# Altium footprint library smd-ipc.PCBLIB: 363 footprints (part 18 of 27) (continued)
## SQFP-S-5X5-48 [mm] (continued)
Mechanical 27:
  lines w0.2: -4.4,-4.4 -4.4,4.4 4.4,4.4 4.4,-4.4 -4.4,-4.4

## SQFP-S-5X5-56 [mm]
pads (56):
  rect 0.17x1.6 smd: 1(-1.95,-3.1) 2(-1.65,-3.1) 3(-1.35,-3.1) 4(-1.05,-3.1) 5(-0.75,-3.1) 6(-0.45,-3.1) 7(-0.15,-3.1) 8(0.15,-3.1) 9(0.45,-3.1) 10(0.75,-3.1) 11(1.05,-3.1) 12(1.35,-3.1) 13(1.65,-3.1) 14(1.95,-3.1) 29(1.95,3.1) 30(1.65,3.1) 31(1.35,3.1) 32(1.05,3.1) 33(0.75,3.1) 34(0.45,3.1) 35(0.15,3.1) 36(-0.15,3.1) 37(-0.45,3.1) 38(-0.75,3.1) 39(-1.05,3.1) 40(-1.35,3.1) 41(-1.65,3.1) 42(-1.95,3.1)
  rect 1.6x0.17 smd: 15(3.1,-1.95) 16(3.1,-1.65) 17(3.1,-1.35) 18(3.1,-1.05) 19(3.1,-0.75) 20(3.1,-0.45) 21(3.1,-0.15) 22(3.1,0.15) 23(3.1,0.45) 24(3.1,0.75) 25(3.1,1.05) 26(3.1,1.35) 27(3.1,1.65) 28(3.1,1.95) 43(-3.1,1.95) 44(-3.1,1.65) 45(-3.1,1.35) 46(-3.1,1.05) 47(-3.1,0.75) 48(-3.1,0.45) 49(-3.1,0.15) 50(-3.1,-0.15) 51(-3.1,-0.45) 52(-3.1,-0.75) 53(-3.1,-1.05) 54(-3.1,-1.35) 55(-3.1,-1.65) 56(-3.1,-1.95)
Top Overlay:
  circle w0.254: c-1.25,-1.25 r0.5
  lines w0.203: -2.2,-2.2 2.2,-2.2 2.2,2.2 -2.2,2.2 -2.2,-2.2
Mechanical 16:
  rectangle: -2.02,-3.6 -1.88,-2.45
  rectangle: -1.72,-3.6 -1.58,-2.45
  rectangle: -1.42,-3.6 -1.28,-2.45
  rectangle: -1.12,-3.6 -0.98,-2.45
  rectangle: -0.82,-3.6 -0.68,-2.45
  rectangle: -0.52,-3.6 -0.38,-2.45
  rectangle: -0.22,-3.6 -0.08,-2.45
  rectangle: 0.08,-3.6 0.22,-2.45
  rectangle: 0.38,-3.6 0.52,-2.45
  rectangle: 0.68,-3.6 0.82,-2.45
  rectangle: 0.98,-3.6 1.12,-2.45
  rectangle: 1.28,-3.6 1.42,-2.45
  rectangle: 1.58,-3.6 1.72,-2.45
  rectangle: 1.88,-3.6 2.02,-2.45
  rectangle: 2.45,-2.02 3.6,-1.88
  rectangle: 2.45,-1.72 3.6,-1.58
  rectangle: 2.45,-1.42 3.6,-1.28
  rectangle: 2.45,-1.12 3.6,-0.98
  rectangle: 2.45,-0.82 3.6,-0.68
  rectangle: 2.45,-0.52 3.6,-0.38
  rectangle: 2.45,-0.22 3.6,-0.08
  rectangle: 2.45,0.08 3.6,0.22
  rectangle: 2.45,0.38 3.6,0.52
  rectangle: 2.45,0.68 3.6,0.82
  rectangle: 2.45,0.98 3.6,1.12
  rectangle: 2.45,1.28 3.6,1.42
  rectangle: 2.45,1.58 3.6,1.72
  rectangle: 2.45,1.88 3.6,2.02
  rectangle: 1.88,2.45 2.02,3.6
  rectangle: 1.58,2.45 1.72,3.6
  rectangle: 1.28,2.45 1.42,3.6
  rectangle: 0.98,2.45 1.12,3.6
  rectangle: 0.68,2.45 0.82,3.6
  rectangle: 0.38,2.45 0.52,3.6
  rectangle: 0.08,2.45 0.22,3.6
  rectangle: -0.22,2.45 -0.08,3.6
  rectangle: -0.52,2.45 -0.38,3.6
  rectangle: -0.82,2.45 -0.68,3.6
  rectangle: -1.12,2.45 -0.98,3.6
  rectangle: -1.42,2.45 -1.28,3.6
  rectangle: -1.72,2.45 -1.58,3.6
  rectangle: -2.02,2.45 -1.88,3.6
  rectangle: -3.6,1.88 -2.45,2.02
  rectangle: -3.6,1.58 -2.45,1.72
  rectangle: -3.6,1.28 -2.45,1.42
  rectangle: -3.6,0.98 -2.45,1.12
  rectangle: -3.6,0.68 -2.45,0.82
  rectangle: -3.6,0.38 -2.45,0.52
  rectangle: -3.6,0.08 -2.45,0.22
  rectangle: -3.6,-0.22 -2.45,-0.08
  rectangle: -3.6,-0.52 -2.45,-0.38
  rectangle: -3.6,-0.82 -2.45,-0.68
  rectangle: -3.6,-1.12 -2.45,-0.98
  rectangle: -3.6,-1.42 -2.45,-1.28
  rectangle: -3.6,-1.72 -2.45,-1.58
  rectangle: -3.6,-2.02 -2.45,-1.88
  lines w0.203: -2.4,-2.4 2.4,-2.4 2.4,2.4 -2.4,2.4 -2.4,-2.4
Mechanical 27:
  lines w0.2: -4.4,-4.4 -4.4,4.4 4.4,4.4 4.4,-4.4 -4.4,-4.4

## SQFP-S-6X6-32 [mm]
pads (32):
  rect 0.3x1.6 smd: 1(-1.75,-3.6) 2(-1.25,-3.6) 3(-0.75,-3.6) 4(-0.25,-3.6) 5(0.25,-3.6) 6(0.75,-3.6) 7(1.25,-3.6) 8(1.75,-3.6) 17(1.75,3.6) 18(1.25,3.6) 19(0.75,3.6) 20(0.25,3.6) 21(-0.25,3.6) 22(-0.75,3.6) 23(-1.25,3.6) 24(-1.75,3.6)
  rect 1.6x0.3 smd: 9(3.6,-1.75) 10(3.6,-1.25) 11(3.6,-0.75) 12(3.6,-0.25) 13(3.6,0.25) 14(3.6,0.75) 15(3.6,1.25) 16(3.6,1.75) 25(-3.6,1.75) 26(-3.6,1.25) 27(-3.6,0.75) 28(-3.6,0.25) 29(-3.6,-0.25) 30(-3.6,-0.75) 31(-3.6,-1.25) 32(-3.6,-1.75)
Top Overlay:
  circle w0.254: c-1.75,-1.75 r0.5
  lines w0.203: -2.7,-2.7 2.7,-2.7 2.7,2.7 -2.7,2.7 -2.7,-2.7
Mechanical 16:
  rectangle: -1.9,-4.1 -1.6,-2.95
  rectangle: -1.4,-4.1 -1.1,-2.95
  rectangle: -0.9,-4.1 -0.6,-2.95
  rectangle: -0.4,-4.1 -0.1,-2.95
  rectangle: 0.1,-4.1 0.4,-2.95
  rectangle: 0.6,-4.1 0.9,-2.95
  rectangle: 1.1,-4.1 1.4,-2.95
  rectangle: 1.6,-4.1 1.9,-2.95
  rectangle: 2.95,-1.9 4.1,-1.6
  rectangle: 2.95,-1.4 4.1,-1.1
  rectangle: 2.95,-0.9 4.1,-0.6
  rectangle: 2.95,-0.4 4.1,-0.1
  rectangle: 2.95,0.1 4.1,0.4
  rectangle: 2.95,0.6 4.1,0.9
  rectangle: 2.95,1.1 4.1,1.4
  rectangle: 2.95,1.6 4.1,1.9
  rectangle: 1.6,2.95 1.9,4.1
  rectangle: 1.1,2.95 1.4,4.1
  rectangle: 0.6,2.95 0.9,4.1
  rectangle: 0.1,2.95 0.4,4.1
  rectangle: -0.4,2.95 -0.1,4.1
  rectangle: -0.9,2.95 -0.6,4.1
  rectangle: -1.4,2.95 -1.1,4.1
  rectangle: -1.9,2.95 -1.6,4.1
  rectangle: -4.1,1.6 -2.95,1.9
  rectangle: -4.1,1.1 -2.95,1.4
  rectangle: -4.1,0.6 -2.95,0.9
  rectangle: -4.1,0.1 -2.95,0.4
  rectangle: -4.1,-0.4 -2.95,-0.1
  rectangle: -4.1,-0.9 -2.95,-0.6
  rectangle: -4.1,-1.4 -2.95,-1.1
  rectangle: -4.1,-1.9 -2.95,-1.6
  lines w0.203: -2.9,-2.9 2.9,-2.9 2.9,2.9 -2.9,2.9 -2.9,-2.9
Mechanical 27:
  lines w0.2: -4.9,-4.9 -4.9,4.9 4.9,4.9 4.9,-4.9 -4.9,-4.9

## SQFP-S-6X6-40 [mm]
pads (40):
  rect 0.3x1.6 smd: 1(-2.25,-3.6) 2(-1.75,-3.6) 3(-1.25,-3.6) 4(-0.75,-3.6) 5(-0.25,-3.6) 6(0.25,-3.6) 7(0.75,-3.6) 8(1.25,-3.6) 9(1.75,-3.6) 10(2.25,-3.6) 21(2.25,3.6) 22(1.75,3.6) 23(1.25,3.6) 24(0.75,3.6) 25(0.25,3.6) 26(-0.25,3.6) 27(-0.75,3.6) 28(-1.25,3.6) 29(-1.75,3.6) 30(-2.25,3.6)
  rect 1.6x0.3 smd: 11(3.6,-2.25) 12(3.6,-1.75) 13(3.6,-1.25) 14(3.6,-0.75) 15(3.6,-0.25) 16(3.6,0.25) 17(3.6,0.75) 18(3.6,1.25) 19(3.6,1.75) 20(3.6,2.25) 31(-3.6,2.25) 32(-3.6,1.75) 33(-3.6,1.25) 34(-3.6,0.75) 35(-3.6,0.25) 36(-3.6,-0.25) 37(-3.6,-0.75) 38(-3.6,-1.25) 39(-3.6,-1.75) 40(-3.6,-2.25)
Top Overlay:
  circle w0.254: c-1.75,-1.75 r0.5
  lines w0.203: -2.7,-2.7 2.7,-2.7 2.7,2.7 -2.7,2.7 -2.7,-2.7
Mechanical 16:
  rectangle: -2.4,-4.1 -2.1,-2.95
  rectangle: -1.9,-4.1 -1.6,-2.95
  rectangle: -1.4,-4.1 -1.1,-2.95
  rectangle: -0.9,-4.1 -0.6,-2.95
  rectangle: -0.4,-4.1 -0.1,-2.95
  rectangle: 0.1,-4.1 0.4,-2.95
  rectangle: 0.6,-4.1 0.9,-2.95
  rectangle: 1.1,-4.1 1.4,-2.95
  rectangle: 1.6,-4.1 1.9,-2.95
  rectangle: 2.1,-4.1 2.4,-2.95
  rectangle: 2.95,-2.4 4.1,-2.1
  rectangle: 2.95,-1.9 4.1,-1.6
  rectangle: 2.95,-1.4 4.1,-1.1
  rectangle: 2.95,-0.9 4.1,-0.6
  rectangle: 2.95,-0.4 4.1,-0.1
  rectangle: 2.95,0.1 4.1,0.4
  rectangle: 2.95,0.6 4.1,0.9
  rectangle: 2.95,1.1 4.1,1.4
  rectangle: 2.95,1.6 4.1,1.9
  rectangle: 2.95,2.1 4.1,2.4
  rectangle: 2.1,2.95 2.4,4.1
  rectangle: 1.6,2.95 1.9,4.1
  rectangle: 1.1,2.95 1.4,4.1
  rectangle: 0.6,2.95 0.9,4.1
  rectangle: 0.1,2.95 0.4,4.1
  rectangle: -0.4,2.95 -0.1,4.1
  rectangle: -0.9,2.95 -0.6,4.1
  rectangle: -1.4,2.95 -1.1,4.1
  rectangle: -1.9,2.95 -1.6,4.1
  rectangle: -2.4,2.95 -2.1,4.1
  rectangle: -4.1,2.1 -2.95,2.4
  rectangle: -4.1,1.6 -2.95,1.9
  rectangle: -4.1,1.1 -2.95,1.4
  rectangle: -4.1,0.6 -2.95,0.9
  rectangle: -4.1,0.1 -2.95,0.4
  rectangle: -4.1,-0.4 -2.95,-0.1
  rectangle: -4.1,-0.9 -2.95,-0.6
  rectangle: -4.1,-1.4 -2.95,-1.1
  rectangle: -4.1,-1.9 -2.95,-1.6
  rectangle: -4.1,-2.4 -2.95,-2.1
  lines w0.203: -2.9,-2.9 2.9,-2.9 2.9,2.9 -2.9,2.9 -2.9,-2.9
Mechanical 27:
  lines w0.2: -5.4,-4.9 -5.4,4.9 4.9,4.9 4.9,-4.9 -5.4,-4.9

## SQFP-S-6X6-40-F [mm]
pads (40):
  rect 0.25x1.6 smd: 1(-1.8,-3.6) 2(-1.4,-3.6) 3(-1,-3.6) 4(-0.6,-3.6) 5(-0.2,-3.6) 6(0.2,-3.6) 7(0.6,-3.6) 8(1,-3.6) 9(1.4,-3.6) 10(1.8,-3.6) 21(1.8,3.6) 22(1.4,3.6) 23(1,3.6) 24(0.6,3.6) 25(0.2,3.6) 26(-0.2,3.6) 27(-0.6,3.6) 28(-1,3.6) 29(-1.4,3.6) 30(-1.8,3.6)
  rect 1.6x0.25 smd: 11(3.6,-1.8) 12(3.6,-1.4) 13(3.6,-1) 14(3.6,-0.6) 15(3.6,-0.2) 16(3.6,0.2) 17(3.6,0.6) 18(3.6,1) 19(3.6,1.4) 20(3.6,1.8) 31(-3.6,1.8) 32(-3.6,1.4) 33(-3.6,1) 34(-3.6,0.6) 35(-3.6,0.2) 36(-3.6,-0.2) 37(-3.6,-0.6) 38(-3.6,-1) 39(-3.6,-1.4) 40(-3.6,-1.8)
Top Overlay:
  circle w0.254: c-1.75,-1.75 r0.5
  lines w0.203: -2.7,-2.7 2.7,-2.7 2.7,2.7 -2.7,2.7 -2.7,-2.7
Mechanical 16:
  rectangle: -1.91,-4.1 -1.69,-2.95
  rectangle: -1.51,-4.1 -1.29,-2.95
  rectangle: -1.11,-4.1 -0.89,-2.95
  rectangle: -0.71,-4.1 -0.49,-2.95
  rectangle: -0.31,-4.1 -0.09,-2.95
  rectangle: 0.09,-4.1 0.31,-2.95
  rectangle: 0.49,-4.1 0.71,-2.95
  rectangle: 0.89,-4.1 1.11,-2.95
  rectangle: 1.29,-4.1 1.51,-2.95
  rectangle: 1.69,-4.1 1.91,-2.95
  rectangle: 2.95,-1.91 4.1,-1.69
  rectangle: 2.95,-1.51 4.1,-1.29
  rectangle: 2.95,-1.11 4.1,-0.89
  rectangle: 2.95,-0.71 4.1,-0.49
  rectangle: 2.95,-0.31 4.1,-0.09
  rectangle: 2.95,0.09 4.1,0.31
  rectangle: 2.95,0.49 4.1,0.71
  rectangle: 2.95,0.89 4.1,1.11
  rectangle: 2.95,1.29 4.1,1.51
  rectangle: 2.95,1.69 4.1,1.91
  rectangle: 1.69,2.95 1.91,4.1
  rectangle: 1.29,2.95 1.51,4.1
  rectangle: 0.89,2.95 1.11,4.1
  rectangle: 0.49,2.95 0.71,4.1
  rectangle: 0.09,2.95 0.31,4.1
  rectangle: -0.31,2.95 -0.09,4.1
  rectangle: -0.71,2.95 -0.49,4.1
  rectangle: -1.11,2.95 -0.89,4.1
  rectangle: -1.51,2.95 -1.29,4.1
  rectangle: -1.91,2.95 -1.69,4.1
  rectangle: -4.1,1.69 -2.95,1.91
  rectangle: -4.1,1.29 -2.95,1.51
  rectangle: -4.1,0.89 -2.95,1.11
  rectangle: -4.1,0.49 -2.95,0.71
  rectangle: -4.1,0.09 -2.95,0.31
  rectangle: -4.1,-0.31 -2.95,-0.09
  rectangle: -4.1,-0.71 -2.95,-0.49
  rectangle: -4.1,-1.11 -2.95,-0.89
  rectangle: -4.1,-1.51 -2.95,-1.29
  rectangle: -4.1,-1.91 -2.95,-1.69
  lines w0.203: -2.9,-2.9 2.9,-2.9 2.9,2.9 -2.9,2.9 -2.9,-2.9
Mechanical 27:
  lines w0.2: -4.9,-4.9 -4.9,4.9 4.9,4.9 4.9,-4.9 -4.9,-4.9

## SQFP-S-6X6-48 [mm]
pads (48):
  rect 0.25x1.6 smd: 1(-2.2,-3.6) 2(-1.8,-3.6) 3(-1.4,-3.6) 4(-1,-3.6) 5(-0.6,-3.6) 6(-0.2,-3.6) 7(0.2,-3.6) 8(0.6,-3.6) 9(1,-3.6) 10(1.4,-3.6) 11(1.8,-3.6) 12(2.2,-3.6) 25(2.2,3.6) 26(1.8,3.6) 27(1.4,3.6) 28(1,3.6) 29(0.6,3.6) 30(0.2,3.6) 31(-0.2,3.6) 32(-0.6,3.6) 33(-1,3.6) 34(-1.4,3.6) 35(-1.8,3.6) 36(-2.2,3.6)
  rect 1.6x0.25 smd: 13(3.6,-2.2) 14(3.6,-1.8) 15(3.6,-1.4) 16(3.6,-1) 17(3.6,-0.6) 18(3.6,-0.2) 19(3.6,0.2) 20(3.6,0.6) 21(3.6,1) 22(3.6,1.4) 23(3.6,1.8) 24(3.6,2.2) 37(-3.6,2.2) 38(-3.6,1.8) 39(-3.6,1.4) 40(-3.6,1) 41(-3.6,0.6) 42(-3.6,0.2) 43(-3.6,-0.2) 44(-3.6,-0.6) 45(-3.6,-1) 46(-3.6,-1.4) 47(-3.6,-1.8) 48(-3.6,-2.2)
Top Overlay:
  circle w0.254: c-1.75,-1.75 r0.5
  lines w0.203: -2.7,-2.7 2.7,-2.7 2.7,2.7 -2.7,2.7 -2.7,-2.7
Mechanical 16:
  rectangle: -2.31,-4.1 -2.09,-2.95
  rectangle: -1.91,-4.1 -1.69,-2.95
  rectangle: -1.51,-4.1 -1.29,-2.95
  rectangle: -1.11,-4.1 -0.89,-2.95
  rectangle: -0.71,-4.1 -0.49,-2.95
  rectangle: -0.31,-4.1 -0.09,-2.95
  rectangle: 0.09,-4.1 0.31,-2.95
  rectangle: 0.49,-4.1 0.71,-2.95
  rectangle: 0.89,-4.1 1.11,-2.95
  rectangle: 1.29,-4.1 1.51,-2.95
  rectangle: 1.69,-4.1 1.91,-2.95
  rectangle: 2.09,-4.1 2.31,-2.95
  rectangle: 2.95,-2.31 4.1,-2.09
  rectangle: 2.95,-1.91 4.1,-1.69
  rectangle: 2.95,-1.51 4.1,-1.29
  rectangle: 2.95,-1.11 4.1,-0.89
  rectangle: 2.95,-0.71 4.1,-0.49
  rectangle: 2.95,-0.31 4.1,-0.09
  rectangle: 2.95,0.09 4.1,0.31
  rectangle: 2.95,0.49 4.1,0.71
  rectangle: 2.95,0.89 4.1,1.11
  rectangle: 2.95,1.29 4.1,1.51
  rectangle: 2.95,1.69 4.1,1.91
  rectangle: 2.95,2.09 4.1,2.31
  rectangle: 2.09,2.95 2.31,4.1
  rectangle: 1.69,2.95 1.91,4.1
  rectangle: 1.29,2.95 1.51,4.1
  rectangle: 0.89,2.95 1.11,4.1
  rectangle: 0.49,2.95 0.71,4.1
  rectangle: 0.09,2.95 0.31,4.1
  rectangle: -0.31,2.95 -0.09,4.1
  rectangle: -0.71,2.95 -0.49,4.1
  rectangle: -1.11,2.95 -0.89,4.1
  rectangle: -1.51,2.95 -1.29,4.1
  rectangle: -1.91,2.95 -1.69,4.1
  rectangle: -2.31,2.95 -2.09,4.1
  rectangle: -4.1,2.09 -2.95,2.31
  rectangle: -4.1,1.69 -2.95,1.91
  rectangle: -4.1,1.29 -2.95,1.51
  rectangle: -4.1,0.89 -2.95,1.11
  rectangle: -4.1,0.49 -2.95,0.71
  rectangle: -4.1,0.09 -2.95,0.31
  rectangle: -4.1,-0.31 -2.95,-0.09
  rectangle: -4.1,-0.71 -2.95,-0.49
  rectangle: -4.1,-1.11 -2.95,-0.89
  rectangle: -4.1,-1.51 -2.95,-1.29
  rectangle: -4.1,-1.91 -2.95,-1.69
  rectangle: -4.1,-2.31 -2.95,-2.09
  lines w0.203: -2.9,-2.9 2.9,-2.9 2.9,2.9 -2.9,2.9 -2.9,-2.9
Mechanical 27:
  lines w0.2: -4.9,-4.9 -4.9,4.9 4.9,4.9 4.9,-4.9 -4.9,-4.9

## SQFP-S-6X6-56 [mm]
pads (56):
  rect 0.17x1.6 smd: 1(-1.95,-3.6) 2(-1.65,-3.6) 3(-1.35,-3.6) 4(-1.05,-3.6) 5(-0.75,-3.6) 6(-0.45,-3.6) 7(-0.15,-3.6) 8(0.15,-3.6) 9(0.45,-3.6) 10(0.75,-3.6) 11(1.05,-3.6) 12(1.35,-3.6) 13(1.65,-3.6) 14(1.95,-3.6) 29(1.95,3.6) 30(1.65,3.6) 31(1.35,3.6) 32(1.05,3.6) 33(0.75,3.6) 34(0.45,3.6) 35(0.15,3.6) 36(-0.15,3.6) 37(-0.45,3.6) 38(-0.75,3.6) 39(-1.05,3.6) 40(-1.35,3.6) 41(-1.65,3.6) 42(-1.95,3.6)
  rect 1.6x0.17 smd: 15(3.6,-1.95) 16(3.6,-1.65) 17(3.6,-1.35) 18(3.6,-1.05) 19(3.6,-0.75) 20(3.6,-0.45) 21(3.6,-0.15) 22(3.6,0.15) 23(3.6,0.45) 24(3.6,0.75) 25(3.6,1.05) 26(3.6,1.35) 27(3.6,1.65) 28(3.6,1.95) 43(-3.6,1.95) 44(-3.6,1.65) 45(-3.6,1.35) 46(-3.6,1.05) 47(-3.6,0.75) 48(-3.6,0.45) 49(-3.6,0.15) 50(-3.6,-0.15) 51(-3.6,-0.45) 52(-3.6,-0.75) 53(-3.6,-1.05) 54(-3.6,-1.35) 55(-3.6,-1.65) 56(-3.6,-1.95)
Top Overlay:
  circle w0.254: c-1.75,-1.75 r0.5
  lines w0.203: -2.7,-2.7 2.7,-2.7 2.7,2.7 -2.7,2.7 -2.7,-2.7
Mechanical 16:
  rectangle: -2.02,-4.1 -1.88,-2.95
  rectangle: -1.72,-4.1 -1.58,-2.95
  rectangle: -1.42,-4.1 -1.28,-2.95
  rectangle: -1.12,-4.1 -0.98,-2.95
  rectangle: -0.82,-4.1 -0.68,-2.95
  rectangle: -0.52,-4.1 -0.38,-2.95
  rectangle: -0.22,-4.1 -0.08,-2.95
  rectangle: 0.08,-4.1 0.22,-2.95
  rectangle: 0.38,-4.1 0.52,-2.95
  rectangle: 0.68,-4.1 0.82,-2.95
  rectangle: 0.98,-4.1 1.12,-2.95
  rectangle: 1.28,-4.1 1.42,-2.95
  rectangle: 1.58,-4.1 1.72,-2.95
  rectangle: 1.88,-4.1 2.02,-2.95
  rectangle: 2.95,-2.02 4.1,-1.88
  rectangle: 2.95,-1.72 4.1,-1.58
  rectangle: 2.95,-1.42 4.1,-1.28
  rectangle: 2.95,-1.12 4.1,-0.98
  rectangle: 2.95,-0.82 4.1,-0.68
  rectangle: 2.95,-0.52 4.1,-0.38
  rectangle: 2.95,-0.22 4.1,-0.08
  rectangle: 2.95,0.08 4.1,0.22
  rectangle: 2.95,0.38 4.1,0.52
  rectangle: 2.95,0.68 4.1,0.82
  rectangle: 2.95,0.98 4.1,1.12
  rectangle: 2.95,1.28 4.1,1.42
  rectangle: 2.95,1.58 4.1,1.72
  rectangle: 2.95,1.88 4.1,2.02
  rectangle: 1.88,2.95 2.02,4.1
  rectangle: 1.58,2.95 1.72,4.1
  rectangle: 1.28,2.95 1.42,4.1
  rectangle: 0.98,2.95 1.12,4.1
  rectangle: 0.68,2.95 0.82,4.1
  rectangle: 0.38,2.95 0.52,4.1
  rectangle: 0.08,2.95 0.22,4.1
  rectangle: -0.22,2.95 -0.08,4.1
  rectangle: -0.52,2.95 -0.38,4.1
  rectangle: -0.82,2.95 -0.68,4.1
  rectangle: -1.12,2.95 -0.98,4.1
  rectangle: -1.42,2.95 -1.28,4.1
  rectangle: -1.72,2.95 -1.58,4.1
  rectangle: -2.02,2.95 -1.88,4.1
  rectangle: -4.1,1.88 -2.95,2.02
  rectangle: -4.1,1.58 -2.95,1.72
  rectangle: -4.1,1.28 -2.95,1.42
  rectangle: -4.1,0.98 -2.95,1.12
  rectangle: -4.1,0.68 -2.95,0.82
  rectangle: -4.1,0.38 -2.95,0.52
  rectangle: -4.1,0.08 -2.95,0.22
  rectangle: -4.1,-0.22 -2.95,-0.08
  rectangle: -4.1,-0.52 -2.95,-0.38
  rectangle: -4.1,-0.82 -2.95,-0.68
  rectangle: -4.1,-1.12 -2.95,-0.98
  rectangle: -4.1,-1.42 -2.95,-1.28
  rectangle: -4.1,-1.72 -2.95,-1.58
  rectangle: -4.1,-2.02 -2.95,-1.88
  lines w0.203: -2.9,-2.9 2.9,-2.9 2.9,2.9 -2.9,2.9 -2.9,-2.9
Mechanical 27:
  lines w0.2: -4.9,-4.9 -4.9,4.9 4.9,4.9 4.9,-4.9 -4.9,-4.9

## SQFP-S-6X6-64 [mm]
pads (64):
  rect 0.17x1.6 smd: 1(-2.25,-3.6) 2(-1.95,-3.6) 3(-1.65,-3.6) 4(-1.35,-3.6) 5(-1.05,-3.6) 6(-0.75,-3.6) 7(-0.45,-3.6) 8(-0.15,-3.6) 9(0.15,-3.6) 10(0.45,-3.6) 11(0.75,-3.6) 12(1.05,-3.6) 13(1.35,-3.6) 14(1.65,-3.6) 15(1.95,-3.6) 16(2.25,-3.6) 33(2.25,3.6) 34(1.95,3.6) 35(1.65,3.6) 36(1.35,3.6) 37(1.05,3.6) 38(0.75,3.6) 39(0.45,3.6) 40(0.15,3.6) 41(-0.15,3.6) 42(-0.45,3.6) 43(-0.75,3.6) 44(-1.05,3.6) 45(-1.35,3.6) 46(-1.65,3.6) 47(-1.95,3.6) 48(-2.25,3.6)
  rect 1.6x0.17 smd: 17(3.6,-2.25) 18(3.6,-1.95) 19(3.6,-1.65) 20(3.6,-1.35) 21(3.6,-1.05) 22(3.6,-0.75) 23(3.6,-0.45) 24(3.6,-0.15) 25(3.6,0.15) 26(3.6,0.45) 27(3.6,0.75) 28(3.6,1.05) 29(3.6,1.35) 30(3.6,1.65) 31(3.6,1.95) 32(3.6,2.25) 49(-3.6,2.25) 50(-3.6,1.95) 51(-3.6,1.65) 52(-3.6,1.35) 53(-3.6,1.05) 54(-3.6,0.75) 55(-3.6,0.45) 56(-3.6,0.15) 57(-3.6,-0.15) 58(-3.6,-0.45) 59(-3.6,-0.75) 60(-3.6,-1.05) 61(-3.6,-1.35) 62(-3.6,-1.65) 63(-3.6,-1.95) 64(-3.6,-2.25)
Top Overlay:
  circle w0.254: c-1.75,-1.75 r0.5
  lines w0.203: -2.7,-2.7 2.7,-2.7 2.7,2.7 -2.7,2.7 -2.7,-2.7
Mechanical 16:
  rectangle: -2.32,-4.1 -2.18,-2.95
  rectangle: -2.02,-4.1 -1.88,-2.95
  rectangle: -1.72,-4.1 -1.58,-2.95
  rectangle: -1.42,-4.1 -1.28,-2.95
  rectangle: -1.12,-4.1 -0.98,-2.95
  rectangle: -0.82,-4.1 -0.68,-2.95
  rectangle: -0.52,-4.1 -0.38,-2.95
  rectangle: -0.22,-4.1 -0.08,-2.95
  rectangle: 0.08,-4.1 0.22,-2.95
  rectangle: 0.38,-4.1 0.52,-2.95
  rectangle: 0.68,-4.1 0.82,-2.95
  rectangle: 0.98,-4.1 1.12,-2.95
  rectangle: 1.28,-4.1 1.42,-2.95
  rectangle: 1.58,-4.1 1.72,-2.95
  rectangle: 1.88,-4.1 2.02,-2.95
  rectangle: 2.18,-4.1 2.32,-2.95
  rectangle: 2.95,-2.32 4.1,-2.18
  rectangle: 2.95,-2.02 4.1,-1.88
  rectangle: 2.95,-1.72 4.1,-1.58
  rectangle: 2.95,-1.42 4.1,-1.28
  rectangle: 2.95,-1.12 4.1,-0.98
  rectangle: 2.95,-0.82 4.1,-0.68
  rectangle: 2.95,-0.52 4.1,-0.38
  rectangle: 2.95,-0.22 4.1,-0.08
  rectangle: 2.95,0.08 4.1,0.22
  rectangle: 2.95,0.38 4.1,0.52
  rectangle: 2.95,0.68 4.1,0.82
  rectangle: 2.95,0.98 4.1,1.12
  rectangle: 2.95,1.28 4.1,1.42
  rectangle: 2.95,1.58 4.1,1.72
  rectangle: 2.95,1.88 4.1,2.02
  rectangle: 2.95,2.18 4.1,2.32
  rectangle: 2.18,2.95 2.32,4.1
  rectangle: 1.88,2.95 2.02,4.1
  rectangle: 1.58,2.95 1.72,4.1
  rectangle: 1.28,2.95 1.42,4.1
  rectangle: 0.98,2.95 1.12,4.1
  rectangle: 0.68,2.95 0.82,4.1
  rectangle: 0.38,2.95 0.52,4.1
  rectangle: 0.08,2.95 0.22,4.1
  rectangle: -0.22,2.95 -0.08,4.1
  rectangle: -0.52,2.95 -0.38,4.1
  rectangle: -0.82,2.95 -0.68,4.1
  rectangle: -1.12,2.95 -0.98,4.1
  rectangle: -1.42,2.95 -1.28,4.1
  rectangle: -1.72,2.95 -1.58,4.1
  rectangle: -2.02,2.95 -1.88,4.1
  rectangle: -2.32,2.95 -2.18,4.1
  rectangle: -4.1,2.18 -2.95,2.32
  rectangle: -4.1,1.88 -2.95,2.02
  rectangle: -4.1,1.58 -2.95,1.72
  rectangle: -4.1,1.28 -2.95,1.42
  rectangle: -4.1,0.98 -2.95,1.12
  rectangle: -4.1,0.68 -2.95,0.82
  rectangle: -4.1,0.38 -2.95,0.52
  rectangle: -4.1,0.08 -2.95,0.22
  rectangle: -4.1,-0.22 -2.95,-0.08
  rectangle: -4.1,-0.52 -2.95,-0.38
  rectangle: -4.1,-0.82 -2.95,-0.68
  rectangle: -4.1,-1.12 -2.95,-0.98
  rectangle: -4.1,-1.42 -2.95,-1.28
  rectangle: -4.1,-1.72 -2.95,-1.58
  rectangle: -4.1,-2.02 -2.95,-1.88
  rectangle: -4.1,-2.32 -2.95,-2.18
  lines w0.203: -2.9,-2.9 2.9,-2.9 2.9,2.9 -2.9,2.9 -2.9,-2.9
Mechanical 27:
  lines w0.2: -4.9,-4.9 -4.9,4.9 4.9,4.9 4.9,-4.9 -4.9,-4.9

## SQFP-S-7X7-40 [mm]
pads (40):
  rect 0.3x1.6 smd: 1(-2.25,-4.1) 2(-1.75,-4.1) 3(-1.25,-4.1) 4(-0.75,-4.1) 5(-0.25,-4.1) 6(0.25,-4.1) 7(0.75,-4.1) 8(1.25,-4.1) 9(1.75,-4.1) 10(2.25,-4.1) 21(2.25,4.1) 22(1.75,4.1) 23(1.25,4.1) 24(0.75,4.1) 25(0.25,4.1) 26(-0.25,4.1) 27(-0.75,4.1) 28(-1.25,4.1) 29(-1.75,4.1) 30(-2.25,4.1)
  rect 1.6x0.3 smd: 11(4.1,-2.25) 12(4.1,-1.75) 13(4.1,-1.25) 14(4.1,-0.75) 15(4.1,-0.25) 16(4.1,0.25) 17(4.1,0.75) 18(4.1,1.25) 19(4.1,1.75) 20(4.1,2.25) 31(-4.1,2.25) 32(-4.1,1.75) 33(-4.1,1.25) 34(-4.1,0.75) 35(-4.1,0.25) 36(-4.1,-0.25) 37(-4.1,-0.75) 38(-4.1,-1.25) 39(-4.1,-1.75) 40(-4.1,-2.25)
Top Overlay:
  circle w0.254: c-2.25,-2.25 r0.5
  lines w0.203: -3.2,-3.2 3.2,-3.2 3.2,3.2 -3.2,3.2 -3.2,-3.2
Mechanical 16:
  rectangle: -2.4,-4.6 -2.1,-3.45
  rectangle: -1.9,-4.6 -1.6,-3.45
  rectangle: -1.4,-4.6 -1.1,-3.45
  rectangle: -0.9,-4.6 -0.6,-3.45
  rectangle: -0.4,-4.6 -0.1,-3.45
  rectangle: 0.1,-4.6 0.4,-3.45
  rectangle: 0.6,-4.6 0.9,-3.45
  rectangle: 1.1,-4.6 1.4,-3.45
  rectangle: 1.6,-4.6 1.9,-3.45
  rectangle: 2.1,-4.6 2.4,-3.45
  rectangle: 3.45,-2.4 4.6,-2.1
  rectangle: 3.45,-1.9 4.6,-1.6
  rectangle: 3.45,-1.4 4.6,-1.1
  rectangle: 3.45,-0.9 4.6,-0.6
  rectangle: 3.45,-0.4 4.6,-0.1
  rectangle: 3.45,0.1 4.6,0.4
  rectangle: 3.45,0.6 4.6,0.9
  rectangle: 3.45,1.1 4.6,1.4
  rectangle: 3.45,1.6 4.6,1.9
  rectangle: 3.45,2.1 4.6,2.4
  rectangle: 2.1,3.45 2.4,4.6
  rectangle: 1.6,3.45 1.9,4.6
  rectangle: 1.1,3.45 1.4,4.6
  rectangle: 0.6,3.45 0.9,4.6
  rectangle: 0.1,3.45 0.4,4.6
  rectangle: -0.4,3.45 -0.1,4.6
  rectangle: -0.9,3.45 -0.6,4.6
  rectangle: -1.4,3.45 -1.1,4.6
  rectangle: -1.9,3.45 -1.6,4.6
  rectangle: -2.4,3.45 -2.1,4.6
  rectangle: -4.6,2.1 -3.45,2.4
  rectangle: -4.6,1.6 -3.45,1.9
  rectangle: -4.6,1.1 -3.45,1.4
  rectangle: -4.6,0.6 -3.45,0.9
  rectangle: -4.6,0.1 -3.45,0.4
  rectangle: -4.6,-0.4 -3.45,-0.1
  rectangle: -4.6,-0.9 -3.45,-0.6
  rectangle: -4.6,-1.4 -3.45,-1.1
  rectangle: -4.6,-1.9 -3.45,-1.6
  rectangle: -4.6,-2.4 -3.45,-2.1
  lines w0.203: -3.4,-3.4 3.4,-3.4 3.4,3.4 -3.4,3.4 -3.4,-3.4
Mechanical 27:
  lines w0.2: -5.4,-5.4 -5.4,5.4 5.4,5.4 5.4,-5.4 -5.4,-5.4

## SQFP-S-7X7-48 [mm]
pads (48):
  rect 0.3x1.6 smd: 1(-2.75,-4.1) 2(-2.25,-4.1) 3(-1.75,-4.1) 4(-1.25,-4.1) 5(-0.75,-4.1) 6(-0.25,-4.1) 7(0.25,-4.1) 8(0.75,-4.1) 9(1.25,-4.1) 10(1.75,-4.1) 11(2.25,-4.1) 12(2.75,-4.1) 25(2.75,4.1) 26(2.25,4.1) 27(1.75,4.1) 28(1.25,4.1) 29(0.75,4.1) 30(0.25,4.1) 31(-0.25,4.1) 32(-0.75,4.1) 33(-1.25,4.1) 34(-1.75,4.1) 35(-2.25,4.1) 36(-2.75,4.1)
  rect 1.6x0.3 smd: 13(4.1,-2.75) 14(4.1,-2.25) 15(4.1,-1.75) 16(4.1,-1.25) 17(4.1,-0.75) 18(4.1,-0.25) 19(4.1,0.25) 20(4.1,0.75) 21(4.1,1.25) 22(4.1,1.75) 23(4.1,2.25) 24(4.1,2.75) 37(-4.1,2.75) 38(-4.1,2.25) 39(-4.1,1.75) 40(-4.1,1.25) 41(-4.1,0.75) 42(-4.1,0.25) 43(-4.1,-0.25) 44(-4.1,-0.75) 45(-4.1,-1.25) 46(-4.1,-1.75) 47(-4.1,-2.25) 48(-4.1,-2.75)
Top Overlay:
  circle w0.254: c-2.25,-2.25 r0.5
  lines w0.203: -3.2,-3.2 3.2,-3.2 3.2,3.2 -3.2,3.2 -3.2,-3.2
Mechanical 16:
  rectangle: -2.9,-4.6 -2.6,-3.45
  rectangle: -2.4,-4.6 -2.1,-3.45
  rectangle: -1.9,-4.6 -1.6,-3.45
  rectangle: -1.4,-4.6 -1.1,-3.45
  rectangle: -0.9,-4.6 -0.6,-3.45
  rectangle: -0.4,-4.6 -0.1,-3.45
  rectangle: 0.1,-4.6 0.4,-3.45
  rectangle: 0.6,-4.6 0.9,-3.45
  rectangle: 1.1,-4.6 1.4,-3.45
  rectangle: 1.6,-4.6 1.9,-3.45
  rectangle: 2.1,-4.6 2.4,-3.45
  rectangle: 2.6,-4.6 2.9,-3.45
  rectangle: 3.45,-2.9 4.6,-2.6
  rectangle: 3.45,-2.4 4.6,-2.1
  rectangle: 3.45,-1.9 4.6,-1.6
  rectangle: 3.45,-1.4 4.6,-1.1
  rectangle: 3.45,-0.9 4.6,-0.6
  rectangle: 3.45,-0.4 4.6,-0.1
  rectangle: 3.45,0.1 4.6,0.4
  rectangle: 3.45,0.6 4.6,0.9
  rectangle: 3.45,1.1 4.6,1.4
  rectangle: 3.45,1.6 4.6,1.9
  rectangle: 3.45,2.1 4.6,2.4
  rectangle: 3.45,2.6 4.6,2.9
  rectangle: 2.6,3.45 2.9,4.6
  rectangle: 2.1,3.45 2.4,4.6
  rectangle: 1.6,3.45 1.9,4.6
  rectangle: 1.1,3.45 1.4,4.6
  rectangle: 0.6,3.45 0.9,4.6
  rectangle: 0.1,3.45 0.4,4.6
  rectangle: -0.4,3.45 -0.1,4.6
  rectangle: -0.9,3.45 -0.6,4.6
  rectangle: -1.4,3.45 -1.1,4.6
  rectangle: -1.9,3.45 -1.6,4.6
  rectangle: -2.4,3.45 -2.1,4.6
  rectangle: -2.9,3.45 -2.6,4.6
  rectangle: -4.6,2.6 -3.45,2.9
  rectangle: -4.6,2.1 -3.45,2.4
  rectangle: -4.6,1.6 -3.45,1.9
  rectangle: -4.6,1.1 -3.45,1.4
  rectangle: -4.6,0.6 -3.45,0.9
  rectangle: -4.6,0.1 -3.45,0.4
  rectangle: -4.6,-0.4 -3.45,-0.1
  rectangle: -4.6,-0.9 -3.45,-0.6
  rectangle: -4.6,-1.4 -3.45,-1.1
  rectangle: -4.6,-1.9 -3.45,-1.6
  rectangle: -4.6,-2.4 -3.45,-2.1
  rectangle: -4.6,-2.9 -3.45,-2.6
  lines w0.203: -3.4,-3.4 3.4,-3.4 3.4,3.4 -3.4,3.4 -3.4,-3.4
Mechanical 27:
  lines w0.2: -5.4,-5.4 -5.4,5.4 5.4,5.4 5.4,-5.4 -5.4,-5.4